# Altium footprint library My_PCB_6_28.PcbLib: 151 footprints (part 3 of 10)
Each footprint in its own frame and in the unit in brackets; x right, y up, seen from the top. Pads: shape width x height; smd on the part's side, far side on the other; paste and mask are expansions set on the pad; w line width, h text height; cw(c..) or ccw(c..) is an arc to the next point about the centre after c.
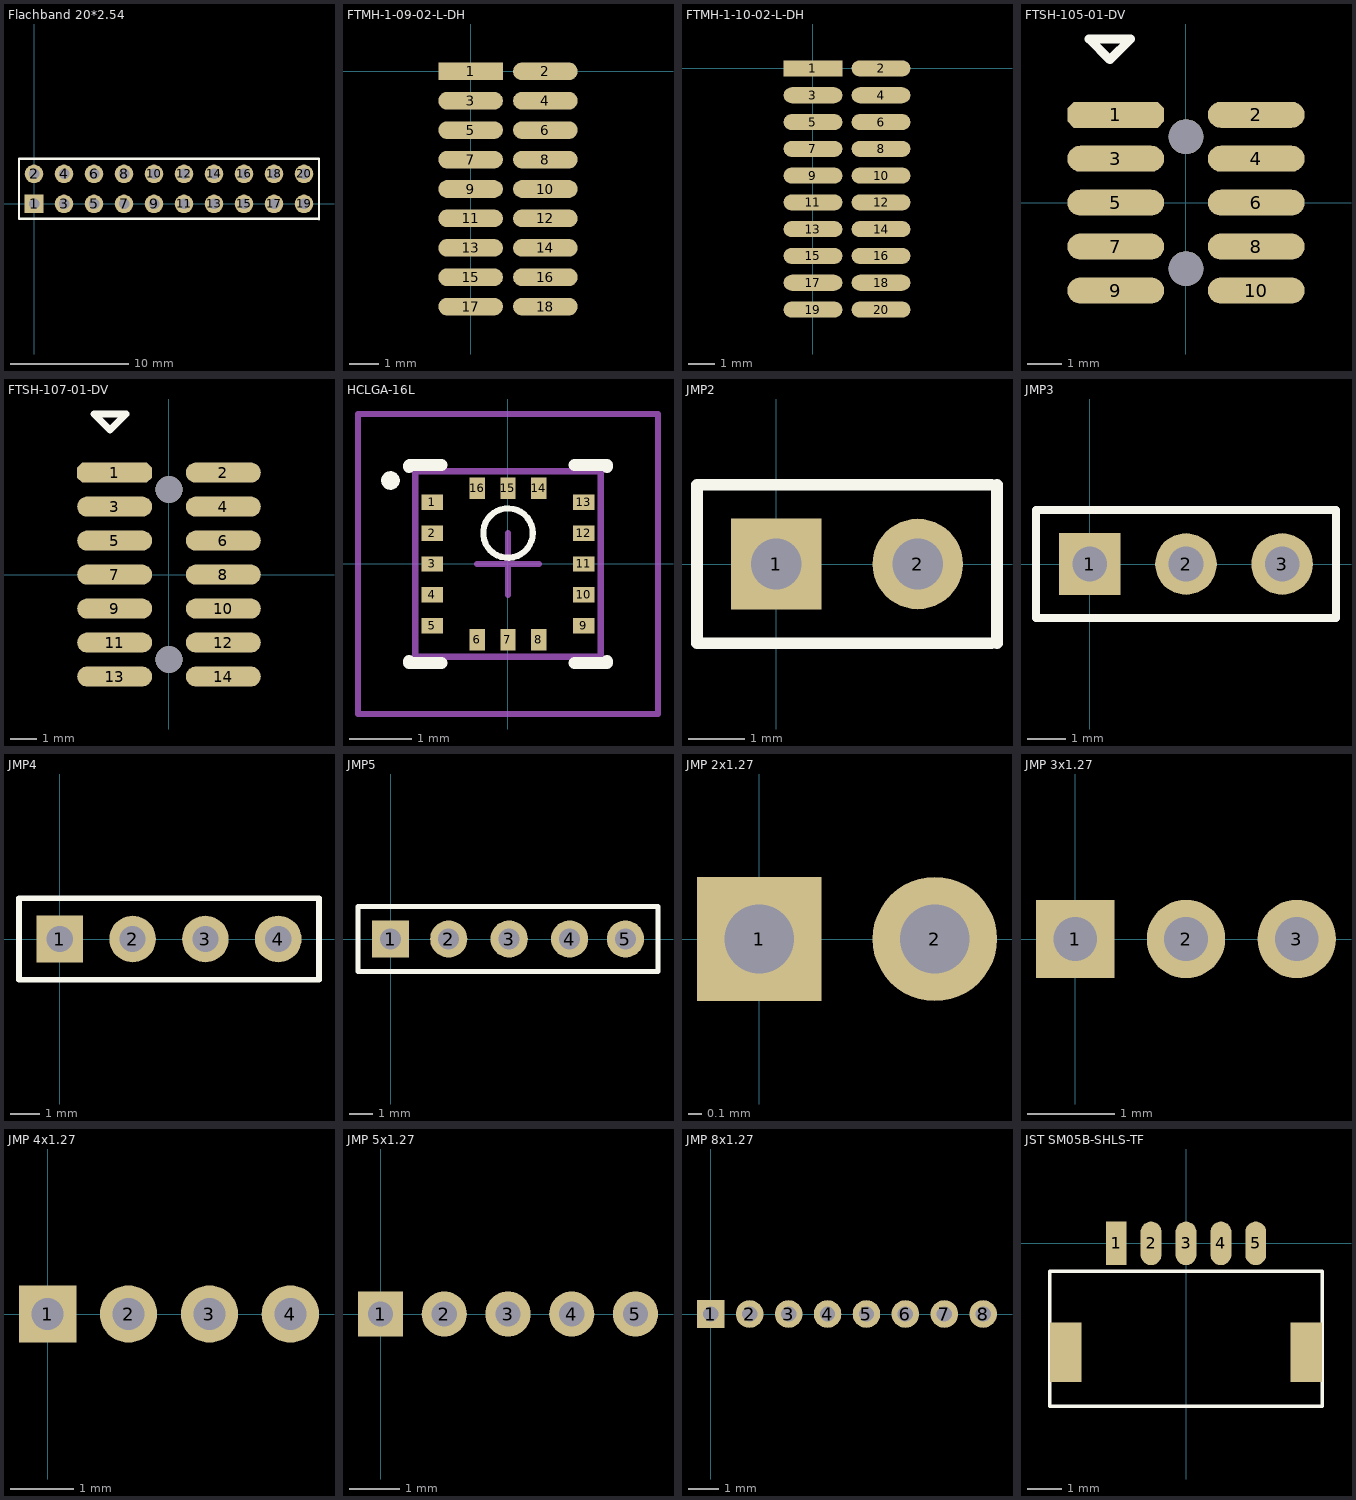
[diagram p2: the footprints below, top view; thin cyan lines are the x and y axes]

## Flachband 20*2.54 [mil]
height 787.4
pads (20):
  rect 62x62 hole 35: 1(0,0)
  round 62 hole 35: 2(0,100) 3(100,0) 4(100,100) 5(200,0) 6(200,100) 7(300,0) 8(300,100) 9(400,0) 10(400,100) 11(500,0) 12(500,100) 13(600,0) 14(600,100) 15(700,0) 16(700,100) 17(800,0) 18(800,100) 19(900,0) 20(900,100)
Top Overlay:
  lines w8: 950,-50.39 950,149.61 ; 950,-50 -50,-50 -50,150 950,150
  text "." at -39.37,-86.61 h50

## FTMH-1-09-02-L-DH [mm]
height 3.2
pads (18):
  rect 2.2x0.6 smd: 1(0,0)
  oval 2.2x0.6 smd: 2(2.54,0) 3(0,-1) 4(2.54,-1) 5(0,-2) 6(2.54,-2) 7(0,-3) 8(2.54,-3) 9(0,-4) 10(2.54,-4) 11(0,-5) 12(2.54,-5) 13(0,-6) 14(2.54,-6) 15(0,-7) 16(2.54,-7) 17(0,-8) 18(2.54,-8)

## FTMH-1-10-02-L-DH [mm]
pads (20):
  rect 2.2x0.6 smd: 1(0,0)
  oval 2.2x0.6 smd: 2(2.54,0) 3(0,-1) 4(2.54,-1) 5(0,-2) 6(2.54,-2) 7(0,-3) 8(2.54,-3) 9(0,-4) 10(2.54,-4) 11(0,-5) 12(2.54,-5) 13(0,-6) 14(2.54,-6) 15(0,-7) 16(2.54,-7) 17(0,-8) 18(2.54,-8) 19(0,-9) 20(2.54,-9)

## FTSH-105-01-DV [mm]
pads (12):
  oct 2.8x0.75 smd: 1(-2.03,2.54)
  oval 2.8x0.75 smd: 2(2.03,2.54) 3(-2.03,1.27) 4(2.03,1.27) 5(-2.03,0) 6(2.03,0) 7(-2.03,-1.27) 8(2.03,-1.27) 9(-2.03,-2.54) 10(2.03,-2.54)
  round 1 hole 1: ""(0,-1.905) ""(0,1.905)
Top Overlay:
  lines w0.254: -2.2,4.13 -1.6,4.73 -2.8,4.73 -2.2,4.13 ; -2.2,4.13 -2.2,4.13

## FTSH-107-01-DV [mm]
pads (16):
  oct 2.8x0.75 smd: 1(-2.03,3.81)
  oval 2.8x0.75 smd: 2(2.03,3.81) 3(-2.03,2.54) 4(2.03,2.54) 5(-2.03,1.27) 6(2.03,1.27) 7(-2.03,0) 8(2.03,0) 9(-2.03,-1.27) 10(2.03,-1.27) 11(-2.03,-2.54) 12(2.03,-2.54) 13(-2.03,-3.81) 14(2.03,-3.81)
  round 1 hole 1: ""(0,-3.175) ""(0,3.175)
Top Overlay:
  lines w0.254: -2.2,5.4 -2.8,6 -1.6,6 -2.2,5.4 ; -2.2,5.4 -2.2,5.4

## HCLGA-16L [mm] "LPS331AP-Drucksensor, 16-Pins, Body 3,2x3,2mm (max), Pitch 0,50mm, IPC Medium Density"
height 1
pads (16):
  rect 0.35x0.25 smd: 1(-1.225,1) 2(-1.225,0.5) 3(-1.225,0) 4(-1.225,-0.5) 5(-1.225,-1) 9(1.225,-1) 10(1.225,-0.5) 11(1.225,0) 12(1.225,0.5) 13(1.225,1)
  rect 0.25x0.35 smd mask+0.102: 6(-0.5,-1.225) 7(0,-1.225) 8(0.5,-1.225) 14(0.5,1.225) 15(0,1.225) 16(-0.5,1.225)
Top Overlay:
  circle w0.1: c0,0.5 r0.4
  circle w0.15: c-1.9,1.35 r0.075
  lines w0.2: -1.6,-1.575 -1.6,-1.6 -1.075,-1.6 ; -1.6,1.575 -1.6,1.587 -1.587,1.6 -1.075,1.6 ; 1.075,-1.6 1.6,-1.6 1.6,-1.575 ; 1.075,1.6 1.6,1.6 1.6,1.575
Mechanical 13:
  lines w0.1: -1.5,-1.5 -1.5,1.488 -1.488,1.5 1.5,1.5 1.5,-1.5 -1.5,-1.5
Mechanical 15:
  lines w0.1: -0.5,0 0.5,0 ; 0,-0.5 0,0.5 ; -2.425,-2.425 -2.425,2.425 2.425,2.425 2.425,-2.425 -2.425,-2.425
3D body: height 1.02, standoff -0.04, extent -1.5,-1.5 1.5,1.5

## JMP2 [mm]
height 20
pads (2):
  rect 1.6x1.6 hole 0.9: 1(0,0)
  round 1.6 hole 0.9: 2(2.5,0)
Top Overlay:
  lines w0.203: 3.8,-1.4 -1.4,-1.4 -1.4,1.4 3.8,1.4 ; 3.9,-1.4 3.9,1.4

## JMP3 [mm]
height 20
pads (3):
  rect 1.6x1.6 hole 0.9: 1(0,0)
  round 1.6 hole 0.9: 2(2.5,0) 3(5,0)
Top Overlay:
  lines w0.203: -1.4,-1.4 -1.4,1.4 6.4,1.4 6.4,-1.4 -1.4,-1.4

## JMP4 [mm]
height 20
pads (4):
  rect 1.6x1.6 hole 0.9: 1(0,0)
  round 1.6 hole 0.9: 2(2.5,0) 3(5,0) 4(7.5,0)
Top Overlay:
  lines w0.2: -1.4,-1.4 8.9,-1.4 8.9,1.4 -1.4,1.4 -1.4,-1.4

## JMP5 [mm]
height 20
pads (5):
  rect 1.6x1.6 hole 0.9: 1(0,0)
  round 1.6 hole 0.9: 2(2.5,0) 3(5.1,0) 4(7.7,0) 5(10.1,0)
Top Overlay:
  lines w0.2: -1.4,-1.4 11.5,-1.4 11.5,1.4 -1.4,1.4 -1.4,-1.4

## JMP 2x1.27 [mm]
pads (2):
  rect 0.9x0.9 hole 0.5: 1(0,0)
  round 0.9 hole 0.5: 2(1.27,0)

## JMP 3x1.27 [mm]
pads (3):
  rect 0.9x0.9 hole 0.5: 1(0,0)
  round 0.9 hole 0.5: 2(1.27,0) 3(2.54,0)

## JMP 4x1.27 [mm]
pads (4):
  rect 0.9x0.9 hole 0.5: 1(0,0)
  round 0.9 hole 0.5: 2(1.27,0) 3(2.54,0) 4(3.81,0)

## JMP 5x1.27 [mm]
pads (5):
  rect 0.9x0.9 hole 0.5: 1(0,0)
  round 0.9 hole 0.5: 2(1.27,0) 3(2.54,0) 4(3.81,0) 5(5.08,0)

## JMP 8x1.27 [mm]
pads (8):
  rect 0.9x0.9 hole 0.5: 1(0,0)
  round 0.9 hole 0.5: 2(1.27,0) 3(2.54,0) 4(3.81,0) 5(5.08,0) 6(6.35,0) 7(7.62,0) 8(8.89,0)

## JST SM05B-SHLS-TF [mm]
height 1.75
pads (7):
  rect 0.6x1.25 smd: 1(-2,0)
  oval 0.6x1.25 smd: 2(-1,0) 3(0,0) 4(1,0) 5(2,0)
  rect 0.9x1.7 smd: ""(-3.45,-3.125) ""(3.45,-3.125)
Top Overlay:
  lines w0.1: -3.9,-4.675 3.9,-4.675 3.9,-0.8 -3.9,-0.8 -3.9,-4.675